# Altium footprint library ARCOM_Connectors.PcbLib: 84 footprints (part 5 of 6)
Each footprint in its own frame and in the unit in brackets; x right, y up, seen from the top. Pads: shape width x height; smd on the part's side, far side on the other; paste and mask are expansions set on the pad; w line width, h text height; cw(c..) or ccw(c..) is an arc to the next point about the centre after c.
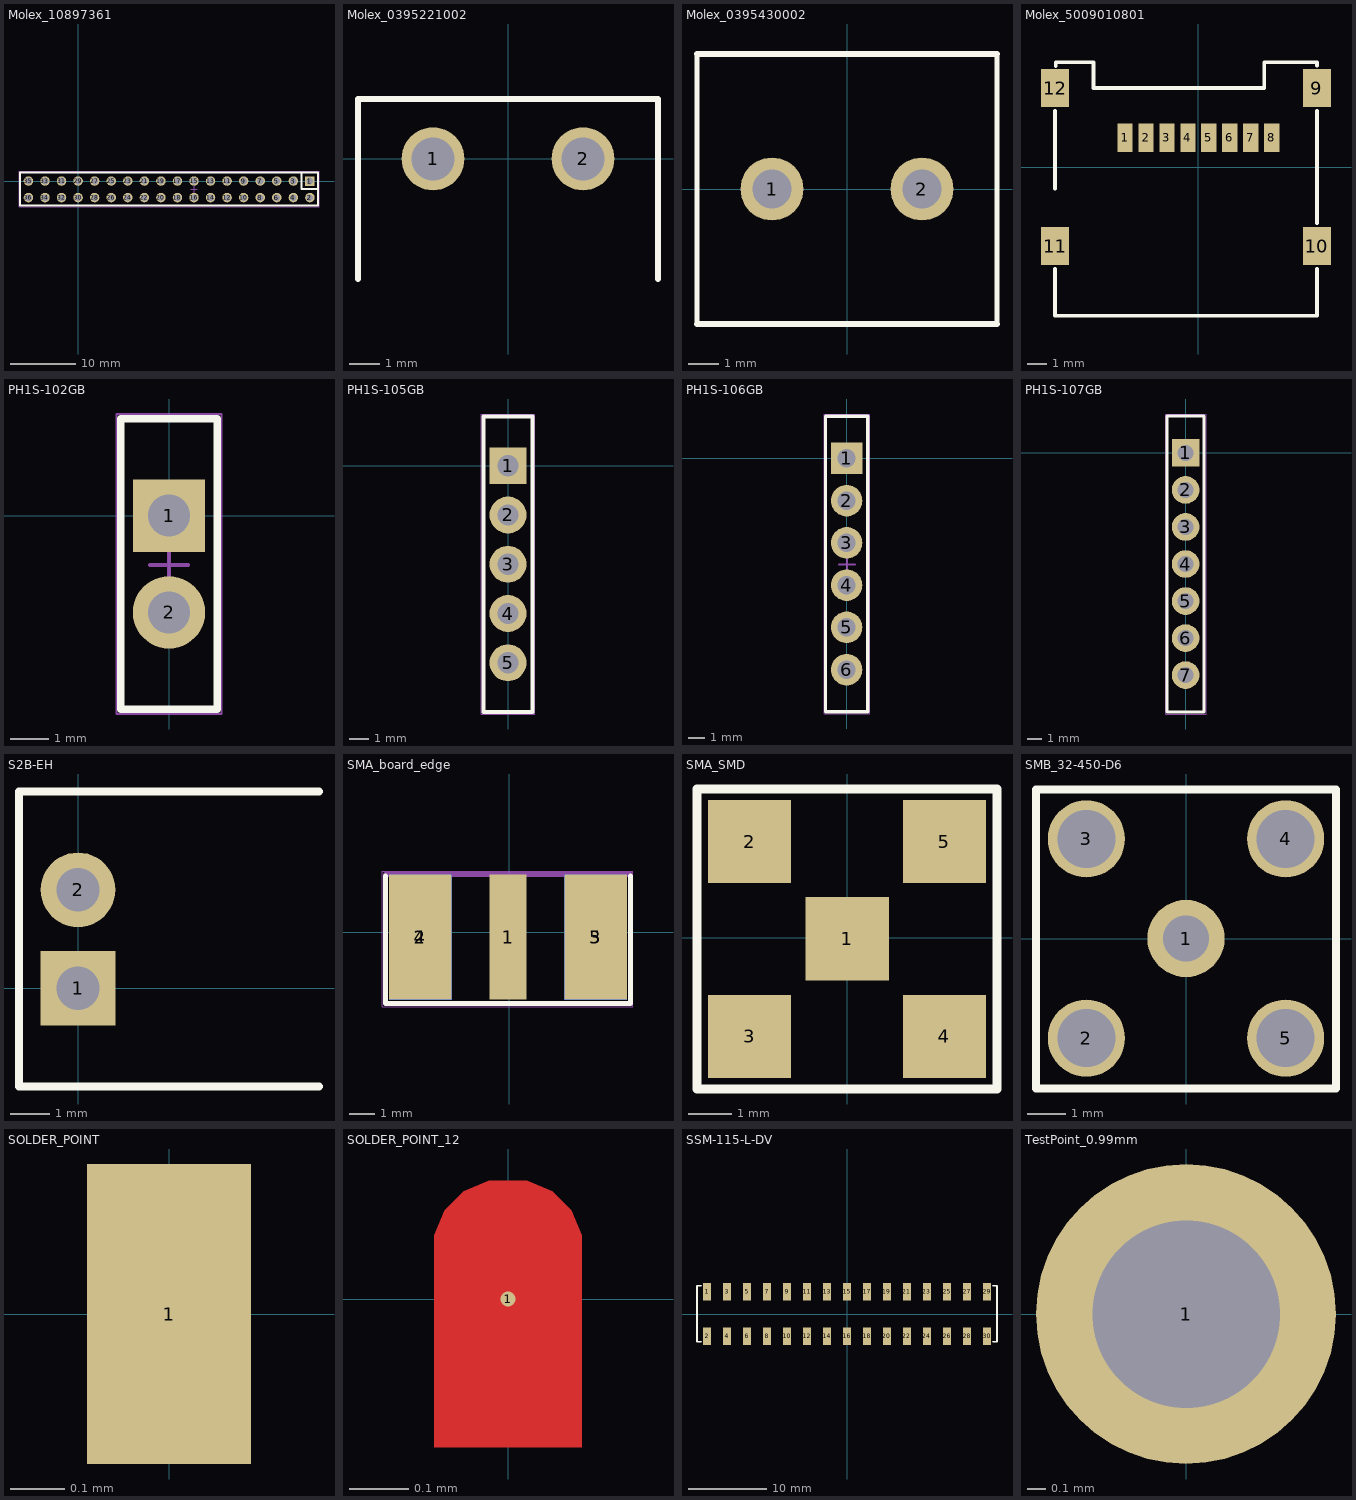
[diagram p4: the footprints below, top view; thin cyan lines are the x and y axes]

## Molex_10897361 [mm]
pads (36):
  rect 1.45x1.45 hole 1.02: 1(35.56,0)
  round 1.45 hole 1.02: 2(35.56,-2.54) 3(33.02,0) 4(33.02,-2.54) 5(30.48,0) 6(30.48,-2.54) 7(27.94,0) 8(27.94,-2.54) 9(25.4,0) 10(25.4,-2.54) 11(22.86,0) 12(22.86,-2.54) 13(20.32,0) 14(20.32,-2.54) 15(17.78,0) 16(17.78,-2.54) 17(15.24,0) 18(15.24,-2.54) 19(12.7,0) 20(12.7,-2.54) 21(10.16,0) 22(10.16,-2.54) 23(7.62,0) 24(7.62,-2.54) 25(5.08,0) 26(5.08,-2.54) 27(2.54,0) 28(2.54,-2.54) 29(0,0) 30(0,-2.54) 31(-2.54,0) 32(-2.54,-2.54) 33(-5.08,0) 34(-5.08,-2.54) 35(-7.62,0) 36(-7.62,-2.54)
Top Overlay:
  lines w0.254: 34.265,1.321 34.265,-1.219 36.805,-1.219 ; -8.915,-3.759 36.805,-3.759 36.805,1.321 -8.915,1.321 -8.915,-3.759
M15 Top Assy:
  lines w0.05: -9.068,-3.912 36.957,-3.912 36.957,1.473 -9.068,1.473 -9.068,-3.912
  lines w0.1: 17.28,-1.27 18.28,-1.27 ; 17.78,-1.77 17.78,-0.77
3D body "10897361.stp": height 8.51, standoff -2.59, extent -8.915,-3.759 36.805,1.321

## Molex_0395221002 [mm]
pads (2):
  round 2.1 hole 1.43: 1(-2.5,0) 2(2.5,0)
Top Overlay:
  lines w0.2: -5,-4.01 -5,2 5,2 5,-4.01
3D body "395221002.stp": height 8.38, standoff -3.81, extent -6.02,-9.906 5.969,2.032

## Molex_0395430002 [mm]
pads (2):
  round 2.1 hole 1.3: 1(-2.5,0) 2(2.5,0)
Top Overlay:
  lines w0.178: -5,-4.5 -5,4.5 ; 5,-4.5 5,4.5
  lines w0.2: -5,-4.5 5,-4.5 ; -5,4.5 5,4.5
3D body "395430002.stp": height 14.63, standoff -3.43, extent -5.004,-4.826 5.004,4.572

## Molex_5009010801 [mm]
pads (12):
  rect 0.8x1.5 smd: 1(-3.85,1.55) 2(-2.75,1.55) 3(-1.65,1.55) 4(-0.55,1.55) 5(0.55,1.55) 6(1.65,1.55) 7(2.75,1.55) 8(3.85,1.55)
  rect 1.45x2 smd: 9(6.225,4.15) 10(6.225,-4.15) 11(-7.525,-4.15) 12(-7.525,4.15)
Top Overlay:
  lines w0.2: -7.525,-7.8 6.225,-7.8 6.225,-5.35 ; -7.52,-7.8 -7.52,-5.35 ; -7.52,-1.125 -7.52,2.95 ; -7.49,5.31 -7.49,5.5 -5.51,5.5 -5.51,4.16 3.46,4.16 3.46,5.5 6.22,5.5 ; 6.22,5.32 6.22,5.49 ; 6.225,-2.95 6.225,2.95
3D body "5009010801.stp": height 1.97, standoff 0.04, extent -7.935,-7.849 6.665,6.651

## PH1S-102GB [mm]
pads (2):
  rect 1.9x1.9 hole 1.1: 1(0,0)
  round 1.9 hole 1.1: 2(0,-2.54)
Top Overlay:
  lines w0.2: -1.27,-5.08 -1.27,2.54 1.27,2.54 1.27,-5.08 -1.27,-5.08
M15 Top Assy:
  lines w0.05: -1.375,-5.207 1.375,-5.207 1.375,2.667 -1.375,2.667 -1.375,-5.207
  lines w0.1: -0.5,-1.295 0.5,-1.295 ; 0,-1.795 0,-0.795

## PH1S-105GB [mm]
pads (5):
  rect 1.9x1.9 hole 1.1: 1(0,0)
  round 1.9 hole 1.1: 2(0,-2.54) 3(0,-5.08) 4(0,-7.62) 5(0,-10.16)
Top Overlay:
  lines w0.2: -1.27,-12.7 1.27,-12.7 1.27,2.54 -1.27,2.54 -1.27,-12.7
M15 Top Assy:
  lines w0.05: -1.375,-12.802 1.375,-12.802 1.375,2.667 -1.375,2.667 -1.375,-12.802
  lines w0.1: -0.5,-5.029 0.5,-5.029 ; 0,-5.529 0,-4.529

## PH1S-106GB [mm]
pads (6):
  rect 1.9x1.9 hole 1.1: 1(0,0)
  round 1.9 hole 1.1: 2(0,-2.54) 3(0,-5.08) 4(0,-7.62) 5(0,-10.16) 6(0,-12.7)
Top Overlay:
  lines w0.2: -1.27,-15.24 -1.27,2.54 1.27,2.54 1.27,-15.24 -1.27,-15.24
M15 Top Assy:
  lines w0.05: -1.35,-15.367 1.4,-15.367 1.4,2.667 -1.35,2.667 -1.35,-15.367
  lines w0.1: -0.475,-6.375 0.525,-6.375 ; 0.025,-6.875 0.025,-5.875

## PH1S-107GB [mm]
pads (7):
  rect 1.9x1.9 hole 1.1: 1(0,0)
  round 1.9 hole 1.1: 2(0,-2.54) 3(0,-5.08) 4(0,-7.62) 5(0,-10.16) 6(0,-12.7) 7(0,-15.24)
Top Overlay:
  lines w0.2: -1.27,-17.78 -1.27,2.54 1.27,2.54 1.27,-17.78 0.635,-17.78 -0.635,-17.78 -1.27,-17.78
M15 Top Assy:
  lines w0.05: -1.35,-17.907 1.4,-17.907 1.4,2.667 -1.35,2.667 -1.35,-17.907
  lines w0.1: -0.475,-7.62 0.525,-7.62 ; 0.025,-8.12 0.025,-7.12

## S2B-EH [mm]
pads (2):
  rect 1.9x1.9 hole 1.1: 1(0,0)
  round 1.9 hole 1.1: 2(0,2.5)
Top Overlay:
  lines w0.2: 6.125,-2.5 -1.5,-2.5 -1.5,5 6.125,5
3D body "S2B-EH.STEP": height 4.24, standoff -3.16, extent -1.535,-2.523 6.665,4.977

## SMA_board_edge [mm]
pads (5):
  rect 1.5x5 smd: 1(-0.047,-0.207)
  rect 2.5x5 smd: 2(-3.547,-0.207) 3(3.453,-0.207)
  rect 2.5x5 smd far side: 4(-3.547,-0.207) 5(3.453,-0.207)
Top Overlay:
  lines w0.2: -4.947,2.243 -4.947,-2.857 4.853,-2.857 4.853,2.243
Mechanical 1:
  lines w0.2: -4.947,2.293 4.853,2.293
M15 Top Assy:
  lines w0.05: -5.08,-2.997 4.953,-2.997 4.953,2.438 -5.08,2.438 -5.08,-2.997
  lines w0.1: -0.5,-0.254 0.5,-0.254 ; 0,-0.754 0,0.246
3D body "SMA_PCB.STEP": height 4.42, standoff -3.5, extent -4.811,-2.413 4.709,15.037

## SMA_SMD [mm]
pads (5):
  rect 1.9x1.9 smd: 1(0,-0.025) 2(-2.23,2.195) 3(-2.23,-2.255) 4(2.22,-2.255) 5(2.22,2.195)
Top Overlay:
  lines w0.2: -3.43,-3.455 -3.43,3.395 3.42,3.395 3.42,-3.455 -3.43,-3.455

## SMB_32-450-D6 [mm]
pads (5):
  round 2 hole 1.2: 1(0,0)
  round 2 hole 1.5: 2(-2.58,-2.58) 3(-2.58,2.58) 4(2.58,2.58) 5(2.58,-2.58)
Top Overlay:
  lines w0.2: -3.886,-3.886 3.886,-3.886 3.886,3.861 -3.886,3.861 -3.886,-3.886
3D body "1-1337482-0.STEP": height 7.62, standoff -3.88, extent -3.525,-3.525 3.475,3.475

## SOLDER_POINT [mm]
pads (2):
  rect 0.3x0.55 smd: 1(0,0)
  round 0 smd paste-25.4 mask-25.4: 1(0.006,0.014)

## SOLDER_POINT_12 [mil]
pads (2):
  round 1 smd: 1(0,0)
  round 0 smd paste-1000 mask-1000: 1(0.23,0.55)
Top Layer:
  region: -4.92,-9.87 -4.92,3.35 -4.92,4.25 -4.23,5.91 -2.96,7.18 -1.29,7.87 -0.39,7.87 0.39,7.87 1.29,7.87 2.96,7.18 4.23,5.91 4.92,4.25 4.92,3.35 4.92,-9.87

## SSM-115-L-DV [mm]
pads (30):
  rect 1.02x2.22 smd: 1(-17.78,2.825) 2(-17.78,-2.825) 3(-15.24,2.825) 4(-15.24,-2.825) 5(-12.7,2.825) 6(-12.7,-2.825) 7(-10.16,2.825) 8(-10.16,-2.825) 9(-7.62,2.825) 10(-7.62,-2.825) 11(-5.08,2.825) 12(-5.08,-2.825) 13(-2.54,2.825) 14(-2.54,-2.825) 15(0,2.825) 16(0,-2.825) 17(2.54,2.825) 18(2.54,-2.825) 19(5.08,2.825) 20(5.08,-2.825) 21(7.62,2.825) 22(7.62,-2.825) 23(10.16,2.825) 24(10.16,-2.825) 25(12.7,2.825) 26(12.7,-2.825) 27(15.24,2.825) 28(15.24,-2.825) 29(17.78,2.825) 30(17.78,-2.825)
Top Overlay:
  lines w0.2: -18.542,-3.525 -19.05,-3.525 -19.05,3.587 -18.542,3.587 ; 18.542,-3.525 19.05,-3.525 19.05,3.587 18.542,3.587
3D body "SSM-115-L-DV.stp": height 7.44, standoff 0.03, extent -19.126,-3.48 18.974,3.556

## TestPoint_0.99mm [mm]
pads (1):
  round 1.6 hole 1: 1(0,0)